# Altium footprint library 电阻封装库.PcbLib: 218 footprints (part 4 of 14)
Each footprint in its own frame and in the unit in brackets; x right, y up, seen from the top. Pads: shape width x height; smd on the part's side, far side on the other; paste and mask are expansions set on the pad; w line width, h text height; cw(c..) or ccw(c..) is an arc to the next point about the centre after c.
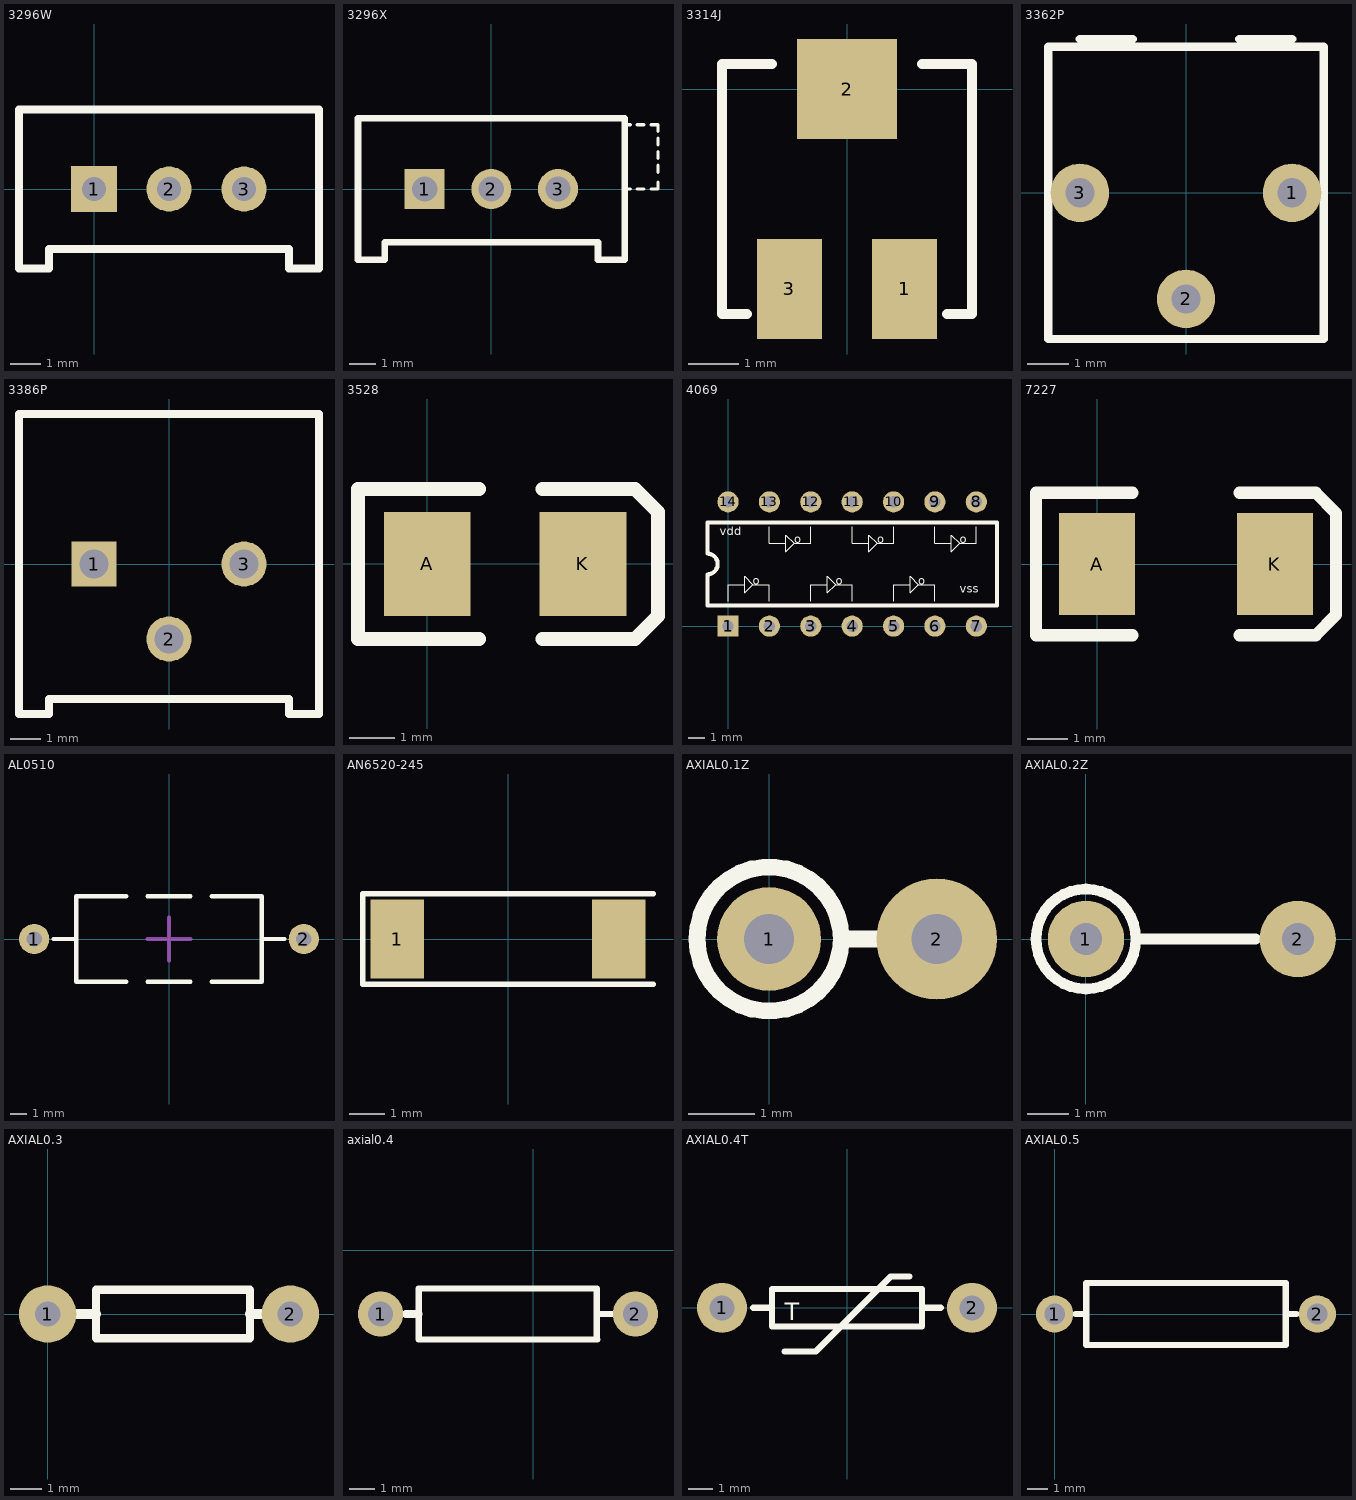
[diagram p3: the footprints below, top view; thin cyan lines are the x and y axes]

## 3296W [mm]
height 0.6
pads (3):
  rect 1.524x1.524 hole 0.8: 1(0,0)
  round 1.5 hole 0.8: 2(2.5,0) 3(5,0)
Top Overlay:
  lines w0.254: -2.5,-2.65 -2.5,2.65 7.5,2.65 7.5,-2.65 6.5,-2.65 6.5,-2 -1.5,-2 -1.5,-2.65 -2.5,-2.65
3D body "3296W BOURNS.STEP": height 11.85, standoff -1.3, extent -2.304,-2.4 7.226,2.4

## 3296X [mm]
pads (3):
  rect 1.5x1.5 hole 0.95: 1(-2.5,0)
  round 1.5 hole 0.95: 2(0,0) 3(2.5,0)
Top Overlay:
  lines w0.127: 4.953,0 5.207,0 ; 4.953,2.413 5.207,2.413 ; 5.461,0 5.715,0 ; 5.461,2.413 5.715,2.413 ; 5.994,0 6.248,0 6.248,0.254 ; 5.994,2.413 6.248,2.413 6.248,2.159 ; 6.248,0.635 6.248,0.889 ; 6.248,1.143 6.248,1.397 ; 6.248,1.651 6.248,1.905
  lines w0.254: -5,-2.65 -5,2.65 5,2.65 5,-2.65 4,-2.65 4,-2 -4,-2 -4,-2.65 -5,-2.65
3D body "3296X BOURNS.STEP": height 10.53, standoff -1.1, extent -4.804,-2.4 6.226,2.4

## 3314J [mm]
pads (3):
  rect 1.3x2 smd: 1(1.15,-4) 3(-1.15,-4)
  rect 2x2 smd: 2(0,0)
Top Overlay:
  lines w0.2: -2,-4.5 -2.5,-4.5 -2.5,0.5 -1.5,0.5 ; 1.5,0.5 2.5,0.5 2.5,-4.5 2,-4.5
3D body "3314J SMT top adj cermet trimmer_4MM.STEP": height 2.67, standoff -0.06, extent -2.449,-4.47 2.55,0.533

## 3362P [mm]
pads (3):
  round 1.4 hole 0.7: 1(2.54,0) 2(0,-2.54) 3(-2.54,0)
Top Overlay:
  lines w0.203: -2.54,3.683 -1.27,3.683 ; 1.27,3.683 2.54,3.683 ; -3.3,-3.5 3.3,-3.5 3.3,3.5 -3.3,3.5 -3.3,-3.5
3D body "Bourns 3362P.STEP": height 5, standoff -5.17, extent -3.365,-3.238 3.235,3.816

## 3386P [mm]
pads (3):
  rect 1.5x1.5 hole 0.95: 1(-2.5,0)
  round 1.5 hole 0.95: 2(0,-2.5) 3(2.5,0)
Top Overlay:
  lines w0.254: -5,-5 -4,-5 -4,-4.5 4,-4.5 4,-5 5,-5 5,5 -5,5 -5,-5
3D body "3386P.STEP": height 5.3, standoff -4.49, extent -4.788,-4.76 4.788,4.816

## 3528 [mil]
pads (2):
  rect 75x90 smd: A(0,0) K(135,0)
Top Overlay:
  lines w12: 45,-65 -60,-65 -60,65 45,65 ; 100,-65 180,-65 200,-45 200,45 180,65 100,65

## 4069 [mm]
pads (14):
  rect 1.3x1.3 hole 0.7: 1(0,0)
  round 1.3 hole 0.7: 2(2.54,0) 3(5.08,0) 4(7.62,0) 5(10.16,0) 6(12.7,0) 7(15.24,0) 8(15.24,7.62) 9(12.7,7.62) 10(10.16,7.62) 11(7.62,7.62) 12(5.08,7.62) 13(2.54,7.62) 14(0,7.62)
Top Overlay:
  lines w0.051: 0,1.524 0,2.54 0.508,2.54 1.016,2.54 ; 2.54,1.524 2.54,2.54 1.524,2.54 ; 2.54,6.096 2.54,5.08 3.048,5.08 3.556,5.08 ; 5.08,1.524 5.08,2.54 5.588,2.54 6.096,2.54 ; 5.08,6.096 5.08,5.08 4.064,5.08 ; 7.62,1.524 7.62,2.54 6.604,2.54 ; 7.62,6.096 7.62,5.08 8.128,5.08 8.636,5.08 ; 10.16,1.524 10.16,2.54 10.668,2.54 11.176,2.54 ; 10.16,6.096 10.16,5.08 9.144,5.08 ; 12.7,1.524 12.7,2.54 11.684,2.54 ; 12.7,6.096 12.7,5.08 13.208,5.08 13.716,5.08 ; 15.24,6.096 15.24,5.08 14.224,5.08 ; 1.524,2.54 1.016,3.048 1.016,2.032 1.524,2.54 ; 4.064,5.08 3.556,5.588 3.556,4.572 4.064,5.08 ; 6.604,2.54 6.096,3.048 6.096,2.032 6.604,2.54 ; 9.144,5.08 8.636,5.588 8.636,4.572 9.144,5.08 ; 11.684,2.54 11.176,3.048 11.176,2.032 11.684,2.54 ; 14.224,5.08 13.716,5.588 13.716,4.572 14.224,5.08
  lines w0.254: -1.27,1.27 -1.27,3.175 ccw(c-1.27,3.81) -1.27,4.445 -1.27,6.35 16.51,6.35 16.51,1.27 -1.27,1.27
  text "o" at 1.524,2.54 h0.51
  text "o" at 6.604,2.54 h0.51
  text "o" at 11.684,2.54 h0.51
  text "o" at 14.224,5.08 h0.51
  text "o" at 9.144,5.08 h0.51
  text "o" at 4.064,5.08 h0.51
  text "vdd" at -0.508,5.588 h0.51
  text "vss" at 14.224,2.032 h0.51

## 7227 [mm]
pads (2):
  rect 1.905x2.54 smd: A(0,0) K(4.445,0)
Top Overlay:
  lines w0.305: 0.889,-1.778 -1.524,-1.778 -1.524,1.778 0.889,1.778 ; 3.556,-1.778 5.461,-1.778 5.969,-1.27 5.969,1.27 5.461,1.778 3.556,1.778

## AL0510 [mm] "16*5*10.5mm（脚距，直径，长度）"
pads (2):
  round 1.8 hole 0.9: 1(-8,0) 2(8,0)
Top Overlay:
  lines w0.254: -6.858,0 -5.5,0 ; -2.54,-2.54 -5.5,-2.54 -5.5,2.54 -2.54,2.54 ; -1.27,-2.54 1.27,-2.54 ; -1.27,2.54 1.27,2.54 ; 2.54,-2.54 5.5,-2.54 5.5,2.54 2.54,2.54 ; 5.5,0 6.858,0
Mechanical 15:
  lines w0.254: -1.27,0 1.27,0 ; 0,-1.27 0,1.27
3D body "AL0510.STEP": height 5.06, standoff -3.5, extent -8.35,-2.509 8.35,2.509

## AN6520-245 [mm]
height 1.2
pads (2):
  rect 1.5x2.2 smd: 1(-3.1,0) ""(3.1,0)
Top Overlay:
  lines w0.152: 4.064,-1.27 -4.064,-1.27 -4.064,1.27 4.064,1.27
3D body "AN6520-245.STEP": height 1.2, standoff 0, extent -3.25,-1.092 3.25,1.108

## AXIAL0.1Z [mil]
pads (2):
  round 62 hole 30: 1(0,0)
  round 72 hole 30: 2(100,0)
Top Overlay:
  circle w10: c0,0 r43.01
  lines w10: 45,0 70,0

## AXIAL0.2Z [mil]
pads (2):
  round 72 hole 30: 1(0,0) 2(200,0)
Top Overlay:
  circle w10: c0,0 r47.17
  lines w10: 50,0 160,0

## AXIAL0.3 [mm]
pads (2):
  round 1.8 hole 0.8: 1(0,0) 2(7.62,0)
Top Overlay:
  lines w0.254: 1.524,-0.762 6.35,-0.762 6.35,0.762 1.524,0.762 1.524,-0.762
  lines w0.305: 0.762,0 1.524,0 ; 6.35,0 6.858,0

## axial0.4 [mm]
pads (2):
  round 1.8 hole 1: 1(-6.096,-2.54) 2(4.064,-2.54)
Top Overlay:
  lines w0.254: 2.516,-3.532 2.516,-1.524 -4.572,-1.524 -4.572,-3.556 2.54,-3.556 ; 2.516,-2.54 3.302,-2.54
  lines w0.305: -5.08,-2.54 -4.572,-2.54

## AXIAL0.4T [mil]
pads (2):
  round 80 hole 40: 1(-200,0) 2(200,0)
Top Overlay:
  lines w10: -150,0 -120,0 ; -100,-70 -50,-70 70,50 100,50 ; 120,0 150,0 ; -120,-30 -120,30 120,30 120,-30 -120,-30
  text "T" at -100,-20 h28

## AXIAL0.5 [mm]
pads (2):
  round 1.8 hole 1: 1(0,0) 2(12.7,0)
Top Overlay:
  lines w0.3: 11.176,-1.5 11.176,1.5
  lines w0.305: 1.016,0 1.524,0 ; 11.176,-1.5 1.524,-1.5 1.524,1.5 11.176,1.5 ; 11.176,0 11.684,0